# Altium footprint library HerosLib.PcbLib: 110 footprints (part 2 of 7)
Each footprint in its own frame and in the unit in brackets; x right, y up, seen from the top. Pads: shape width x height; smd on the part's side, far side on the other; paste and mask are expansions set on the pad; w line width, h text height; cw(c..) or ccw(c..) is an arc to the next point about the centre after c.
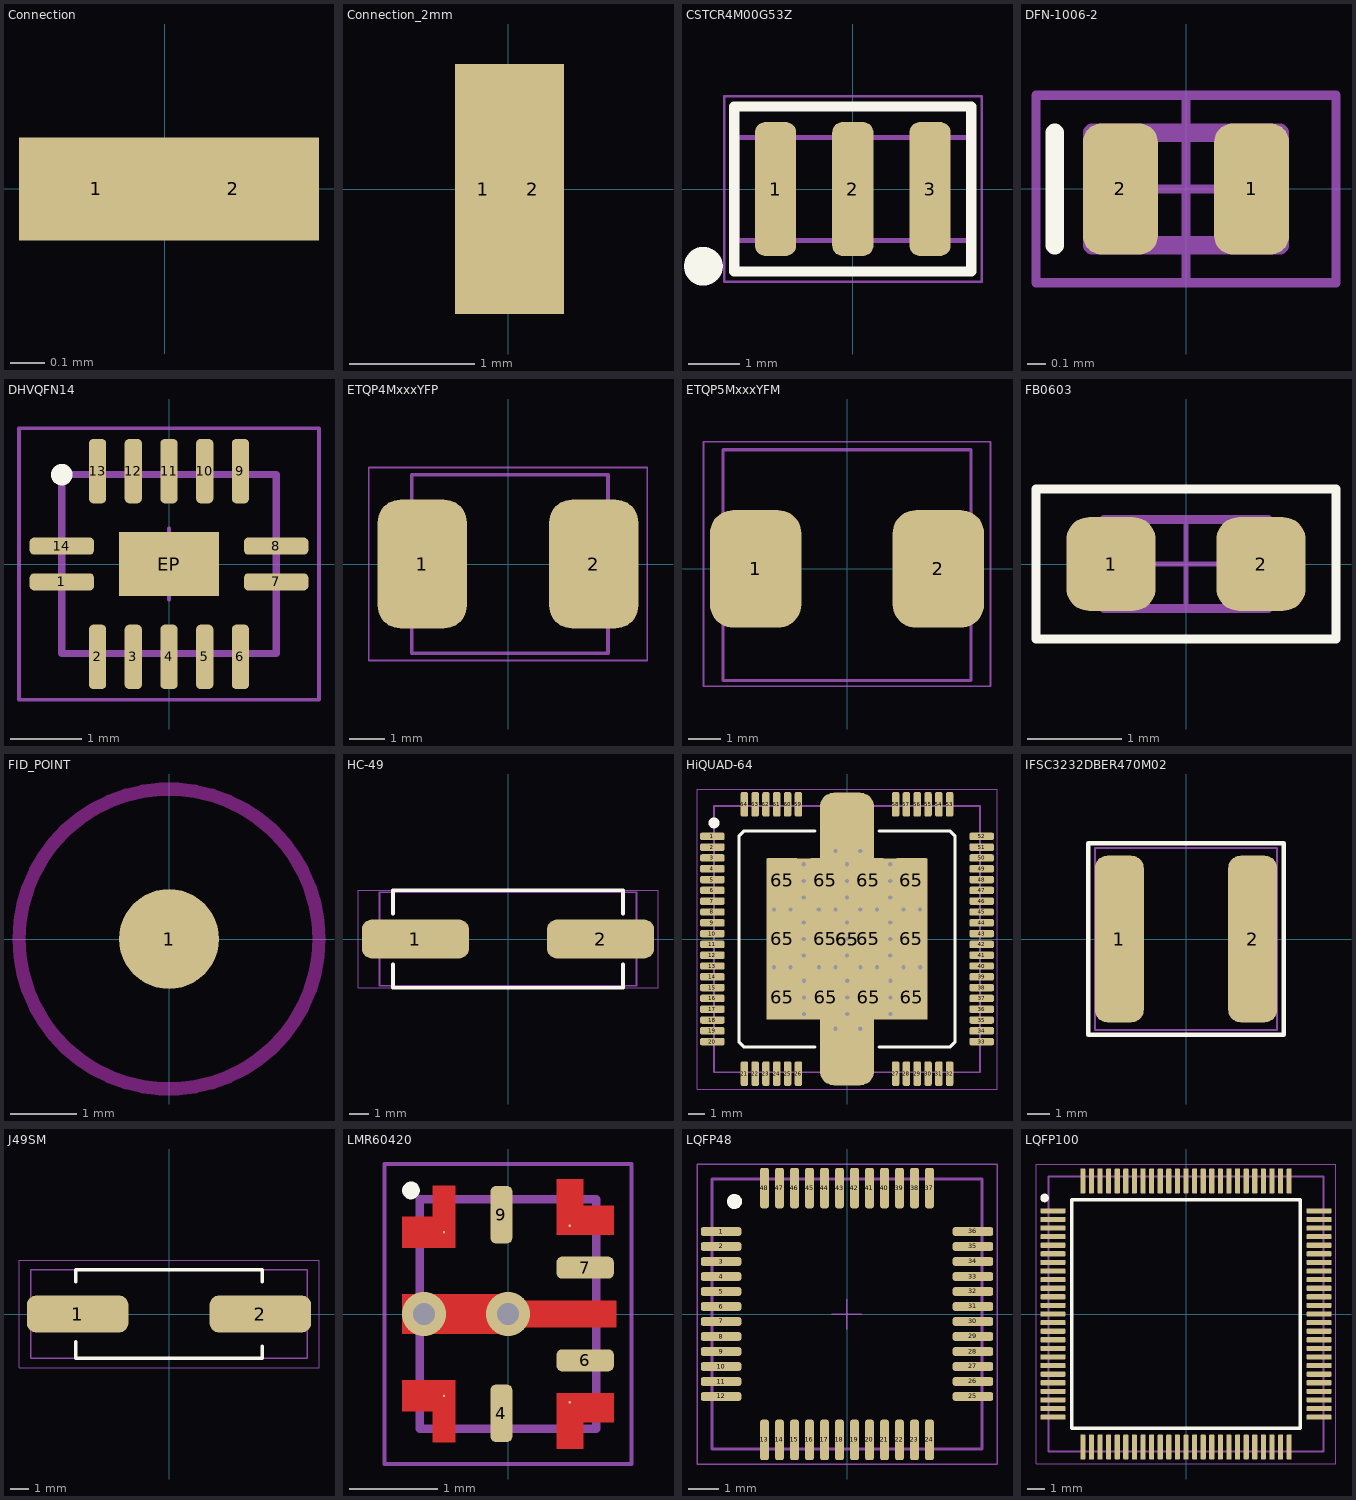
[diagram p1: the footprints below, top view; thin cyan lines are the x and y axes]

## Connection [mm] "No component PCB connection"
pads (2):
  rect 0.45x0.3 smd mask+0.102: 1(-0.2,0)
  rect 0.5x0.3 smd mask+0.102: 2(0.2,0)

## Connection_2mm [mm] "No component PCB connection"
pads (2):
  rect 0.45x2 smd mask+0.102: 1(-0.2,0)
  rect 0.5x2 smd mask+0.102: 2(0.2,0)

## CSTCR4M00G53Z [mm] "0.177\" L x 0.079\" W (4.50mm x 2.00mm)"
height 1.19
pads (3):
  rrect50% 0.8x2.6 smd: 1(-1.5,0) 2(0,0) 3(1.5,0)
Top Overlay:
  circle w0.5: c-2.9,-1.5 r0.125
  lines w0.2: -2.3,-1.6 2.3,-1.6 2.3,1.6 -2.3,1.6 -2.3,-1.6
Mechanical 13:
  lines w0.1: -2.25,-1 -2.25,1 2.3,1 2.3,-1 -2.25,-1
Mechanical 15:
  lines w0.05: -2.5,-1.8 2.5,-1.8 2.5,1.8 -2.5,1.8 -2.5,-1.8
3D body "CSTCR4M00G53Z-R0.STEP": height 1.2, standoff 0, extent -2.25,-1 2.25,1

## DFN-1006-2 [mm] "1 x 0.6mm"
height 0.5
pads (2):
  rrect50% 0.4x0.7 smd: 1(0.35,0) 2(-0.35,0)
Top Overlay:
  lines w0.1: -0.7,-0.3 -0.7,0.3
Mechanical 13:
  lines w0.1: -0.5,-0.3 0.5,-0.3 0.5,0.3 -0.5,0.3 -0.5,-0.3
Mechanical 15:
  lines w0.05: -0.5,0 0.5,0 ; 0,-0.5 0,0.5 ; -0.8,-0.5 0.8,-0.5 0.8,0.5 -0.8,0.5 -0.8,-0.5
3D body "DFN1006-2.stp": height 0.5, standoff 0, extent -0.5,-0.3 0.5,0.3

## DHVQFN14 [mm] "plastic, leadless dual in-line compatible thermal enhanced / very thin quad flat package; 14 terminals; 0.5 mm pitch; 2.5x3x1 mm body"
height 1
pads (15):
  rrect50% 0.9x0.24 smd: 1(-1.5,-0.25) 7(1.5,-0.25) 8(1.5,0.25) 14(-1.5,0.25)
  rrect50% 0.24x0.9 smd: 2(-1,-1.3) 3(-0.5,-1.3) 4(0,-1.3) 5(0.5,-1.3) 6(1,-1.3) 9(1,1.3) 10(0.5,1.3) 11(0,1.3) 12(-0.5,1.3) 13(-1,1.3)
  rect 1.4x0.9 smd paste-2539.97: EP(0,0)
Top Overlay:
  circle w0.2: c-1.501,1.251 r0.05
Top Paste:
  rectangle: -0.3,-0.2 0.3,0.2
Mechanical 13:
  lines w0.1: -1.501,-1.251 -1.501,1.251 1.501,1.251 1.501,-1.251 -1.501,-1.251
Mechanical 15:
  lines w0.05: -0.5,0 0.5,0 ; 0,-0.5 0,0.5 ; -2.1,-1.9 -2.1,1.9 2.1,1.9 2.1,-1.9 -2.1,-1.9
3D body "User Library-DHVQFN 14.STEP": height 0.85, standoff -0.02, extent -1.501,-1.251 1.501,1.251

## ETQP4MxxxYFP [mm] "5.5mm x5mm inductor package"
height 4
pads (2):
  rrect50% 2.5x3.6 smd: 1(-2.4,0) 2(2.4,0)
Mechanical 13:
  lines w0.1: -2.7,-2.5 -2.7,2.5 2.8,2.5 2.8,-2.5 -2.7,-2.5
Mechanical 15:
  lines w0.05: -3.9,-2.7 3.9,-2.7 3.9,2.7 -3.9,2.7 -3.9,-2.7
3D body "ast-ind-365935.STEP": height 4.08, standoff 0.08, extent -2.75,-2.5 2.75,2.5

## ETQP5MxxxYFM [mm] "7.5mm x7mm inductor package"
height 5.4
pads (2):
  rrect50% 2.8x3.6 smd: 1(-2.8,0) 2(2.8,0)
Mechanical 13:
  lines w0.1: -3.8,-3.425 3.8,-3.425 3.8,3.65 -3.8,3.65 -3.8,-3.425
Mechanical 15:
  lines w0.05: -4.4,-3.6 -4.4,3.9 4.4,3.9 4.4,-3.6 -4.4,-3.6
3D body "ast-ind-365942.STEP": height 5.49, standoff 0.09, extent -3.785,-3.375 3.785,3.625

## FB0603 [mm] "Chip Resistor, 2-Leads, Body 1.75x0.95mm"
height 0.55
pads (2):
  rrect50% 0.95x1 smd: 1(-0.8,0) 2(0.8,0)
Top Overlay:
  lines w0.1: -1.6,-0.8 1.6,-0.8 1.6,0.8 -1.6,0.8 -1.6,0.575 -1.6,-0.8
Mechanical 13:
  lines w0.1: -0.875,-0.475 -0.875,0.475 0.875,0.475 0.875,-0.475 -0.875,-0.475
Mechanical 15:
  lines w0.05: -0.5,0 0.5,0 ; 0,-0.5 0,0.5 ; -1.6,-0.8 -1.6,0.8 1.6,0.8 1.6,-0.8 -1.6,-0.8
3D body "RESC1608X06N.step": height 0.55, standoff 0, extent -0.875,-0.475 0.875,0.475

## FID_POINT [mm] "Fiducial point, 1.5 mm x 4.5 mm solder free area"
pads (1):
  round 1.5 smd paste-1.5 mask+1.5: 1(0,0)
Top Layer keep-out:
  circle w0.2: c0,0 r2.25

## HC-49 [mm] "SMD Quartz Crystal, 2 pad version, 11.4 x 4.8 mm"
height 4.3
pads (2):
  rrect50% 5.5x2 smd: 1(-4.75,0) 2(4.75,0)
Top Overlay:
  lines w0.2: -5.9,-1.3 -5.9,-2.5 0,-2.5 5.9,-2.5 5.9,-1.3 ; -5.9,1.3 -5.9,2.5 0,2.5 5.9,2.5 5.9,1.3
Mechanical 13:
  lines w0.1: -6.6,-2.4 -6.6,2.4 6.6,2.4 6.6,-2.4 -6.6,-2.4
Mechanical 15:
  lines w0.05: -7.7,-2.5 7.7,-2.5 7.7,2.5 -7.7,2.5 -7.7,-2.5
3D body "ECS-040-18-5PX-JES-TR.STEP": height 4.3, standoff 0, extent -6.6,-2.39 6.6,2.41

## HiQUAD-64 [mm] "64-Pin HI-QUAD package"
height 2
pads (78):
  rrect50% 1.475x0.45 smd mask+0.05: 1(-8.1,6.175) 2(-8.1,5.525) 3(-8.1,4.875) 4(-8.1,4.225) 5(-8.1,3.575) 6(-8.1,2.925) 7(-8.1,2.275) 8(-8.1,1.625) 9(-8.1,0.975) 10(-8.1,0.325) 11(-8.1,-0.325) 12(-8.1,-0.975) 13(-8.1,-1.625) 14(-8.1,-2.275) 15(-8.1,-2.925) 16(-8.1,-3.575) 17(-8.1,-4.225) 18(-8.1,-4.875) 19(-8.1,-5.525) 20(-8.1,-6.175) 33(8.1,-6.175) 34(8.1,-5.525) 35(8.1,-4.875) 36(8.1,-4.225) 37(8.1,-3.575) 38(8.1,-2.925) 39(8.1,-2.275) 40(8.1,-1.625) 41(8.1,-0.975) 42(8.1,-0.325) 43(8.1,0.325) 44(8.1,0.975) 45(8.1,1.625) 46(8.1,2.275) 47(8.1,2.925) 48(8.1,3.575) 49(8.1,4.225) 50(8.1,4.875) 51(8.1,5.525) 52(8.1,6.175)
  rrect50% 0.45x1.475 smd mask+0.05: 21(-6.175,-8.1) 22(-5.525,-8.1) 23(-4.875,-8.1) 24(-4.225,-8.1) 25(-3.575,-8.1) 26(-2.925,-8.1) 27(2.925,-8.1) 28(3.575,-8.1) 29(4.225,-8.1) 30(4.875,-8.1) 31(5.525,-8.1) 32(6.175,-8.1) 53(6.175,8.1) 54(5.525,8.1) 55(4.875,8.1) 56(4.225,8.1) 57(3.575,8.1) 58(2.925,8.1) 59(-2.925,8.1) 60(-3.575,8.1) 61(-4.225,8.1) 62(-4.875,8.1) 63(-5.525,8.1) 64(-6.175,8.1)
  rect 1.8x2.7 smd paste-10: 65(-3.896,0.021) 65(-3.896,3.521) 65(-3.883,-3.493) 65(-1.304,0.021) 65(-1.304,3.521) 65(-1.291,-3.493) 65(1.287,0.021) 65(1.287,3.521) 65(1.301,-3.493) 65(3.879,0.021) 65(3.879,3.521) 65(3.892,-3.493)
  rrect50% 3.25x17.6 smd paste-10 mask+0.102: 65(0,0)
  rect 9.7x9.7 smd paste-10 mask+0.102: 65(0,0)
via 0,0 diameter 0.5 hole 0.25
via 0.8,-5.4 diameter 0.5 hole 0.25
via -0.7,-5.4 diameter 0.5 hole 0.25
via 0.8,5.3 diameter 0.5 hole 0.25
via -0.7,5.3 diameter 0.5 hole 0.25
via 3.406,-1.698 diameter 0.5 hole 0.25
via 4.406,-1.698 diameter 0.5 hole 0.25
via 0.806,-1.698 diameter 0.5 hole 0.25
via 1.806,-1.698 diameter 0.5 hole 0.25
via -1.694,-1.698 diameter 0.5 hole 0.25
via -0.694,-1.698 diameter 0.5 hole 0.25
via -4.394,-1.698 diameter 0.5 hole 0.25
via -3.394,-1.698 diameter 0.5 hole 0.25
via 3.4,1.769 diameter 0.5 hole 0.25
via 4.4,1.769 diameter 0.5 hole 0.25
via 0.8,1.769 diameter 0.5 hole 0.25
via 1.8,1.769 diameter 0.5 hole 0.25
via -1.7,1.769 diameter 0.5 hole 0.25
via -0.7,1.769 diameter 0.5 hole 0.25
via -4.4,1.769 diameter 0.5 hole 0.25
via -3.4,1.769 diameter 0.5 hole 0.25
via -2.587,-4.514 diameter 0.5 hole 0.25
via -2.587,-2.514 diameter 0.5 hole 0.25
via -2.587,-3.514 diameter 0.5 hole 0.25
via 0.013,-4.514 diameter 0.5 hole 0.25
via 0.013,-2.514 diameter 0.5 hole 0.25
via 0.013,-3.514 diameter 0.5 hole 0.25
via 2.613,-4.514 diameter 0.5 hole 0.25
via 2.613,-2.514 diameter 0.5 hole 0.25
via 2.613,-3.514 diameter 0.5 hole 0.25
via 2.6,-1 diameter 0.5 hole 0.25
via 2.6,1 diameter 0.5 hole 0.25
via 2.6,0 diameter 0.5 hole 0.25
via -2.6,-1 diameter 0.5 hole 0.25
via -2.6,1 diameter 0.5 hole 0.25
via -2.6,0 diameter 0.5 hole 0.25
via -2.6,2.5 diameter 0.5 hole 0.25
via -2.6,4.5 diameter 0.5 hole 0.25
via -2.6,3.5 diameter 0.5 hole 0.25
via 2.6,2.5 diameter 0.5 hole 0.25
via 2.6,4.5 diameter 0.5 hole 0.25
via 2.6,3.5 diameter 0.5 hole 0.25
via 0,2.5 diameter 0.5 hole 0.25
via 0,4.5 diameter 0.5 hole 0.25
via 0,3.5 diameter 0.5 hole 0.25
via 0,-1 diameter 0.5 hole 0.25
via 0,1 diameter 0.5 hole 0.25
Top Overlay:
  circle w0.325: c-8.001,6.985 r0.162
  lines w0.2: -1.95,-6.5 -6.175,-6.5 -6.5,-6.175 -6.5,6.175 -6.175,6.5 -1.95,6.5 ; 1.95,-6.5 6.175,-6.5 6.5,-6.175 6.5,6.175 6.175,6.5 1.95,6.5
Top Paste:
  rectangle: 3,-4.7 4.7,-2
  rectangle: 3,-1.3 4.7,1.4
  rectangle: 3,2.1 4.7,4.8
  rectangle: 0.4,-4.7 2.1,-2
  rectangle: 0.4,-1.3 2.1,1.4
  rectangle: 0.4,2.1 2.1,4.8
  rectangle: -2.2,-4.7 -0.5,-2
  rectangle: -2.2,-1.3 -0.5,1.4
  rectangle: -2.2,2.1 -0.5,4.8
  rectangle: -4.7,-4.7 -3,-2
  rectangle: -4.7,-1.3 -3,1.4
  rectangle: -4.7,2.1 -3,4.8
  region: -1.651,6.015 -1.651,8.047 -1.651,8.122 -1.622,8.269 -1.564,8.408 -1.481,8.533 -1.375,8.639 -1.25,8.722 -1.111,8.78 -0.964,8.809 -0.889,8.809 0.889,8.809 0.964,8.809 1.111,8.78 1.25,8.722 1.375,8.639 1.481,8.533 1.564,8.408 1.622,8.269 1.651,8.122 1.651,8.047 1.651,6.015
  region: 1.651,-6.015 1.651,-8.047 1.651,-8.122 1.622,-8.269 1.564,-8.408 1.481,-8.533 1.375,-8.639 1.25,-8.722 1.111,-8.78 0.964,-8.809 0.889,-8.809 -0.889,-8.809 -0.964,-8.809 -1.111,-8.78 -1.25,-8.722 -1.375,-8.639 -1.481,-8.533 -1.564,-8.408 -1.622,-8.269 -1.651,-8.122 -1.651,-8.047 -1.651,-6.015
Top Solder:
  region: -1.778,5.888 -1.778,8.047 -1.778,8.135 -1.744,8.306 -1.677,8.468 -1.579,8.614 -1.456,8.738 -1.31,8.835 -1.148,8.902 -0.977,8.936 -0.889,8.936 0.889,8.936 0.977,8.936 1.148,8.902 1.31,8.835 1.456,8.738 1.58,8.614 1.677,8.468 1.744,8.306 1.778,8.134 1.778,8.047 1.778,5.888
  region: 1.778,-5.888 1.778,-8.047 1.778,-8.135 1.744,-8.306 1.677,-8.468 1.579,-8.614 1.456,-8.738 1.31,-8.835 1.148,-8.902 0.977,-8.936 0.889,-8.936 -0.889,-8.936 -0.977,-8.936 -1.148,-8.902 -1.31,-8.835 -1.456,-8.738 -1.58,-8.614 -1.677,-8.468 -1.744,-8.306 -1.778,-8.134 -1.778,-8.047 -1.778,-5.888
Mechanical 13:
  lines w0.1: -8.005,-8.008 8,-8.008 8,8.001 -8.005,8.001 -8.005,-8.008
Mechanical 15:
  lines w0.05: -9.025,-9.025 -9.025,9.025 9.025,9.025 9.025,-9.025 -9.025,-9.025
3D body "HiQUAD-64X.stp": height 1.6, standoff 0.01, extent -8.005,-8.008 8.005,8.001

## IFSC3232DBER470M02 [mm] "8mm x 8mm inductor package"
height 4.2
pads (2):
  rrect50% 2.2x7.5 smd: 1(-3,0) 2(3,0)
Top Overlay:
  lines w0.2: -4.4,-4.3 -4.4,4.3 4.4,4.3 4.4,-4.3 -4.4,-4.3
Mechanical 13:
  lines w0.1: -4.1,-4.1 -4.1,4.1 4.1,4.1 4.1,-4.1 -4.1,-4.1
Mechanical 15:
  lines w0.05: -4.4,-4.3 4.4,-4.3 4.4,4.3 -4.4,4.3 -4.4,-4.3
3D body "IND_IFSC-3232DB-01_VIS.step": height 4.19, standoff 0, extent -4.102,-4.102 4.102,4.102

## J49SM [mm] "SMD Quartz Crystal, 2 pad version, 11.5 x 4.8 mm"
height 4
pads (2):
  rrect50% 5.5x2 smd: 1(-4.95,0) 2(4.95,0)
Top Overlay:
  lines w0.2: -5.05,-2.4 -5.05,-1.5 -5.05,-2.4 ; -5.05,-2.4 5,-2.4 -5.05,-2.4 ; -5.05,2.4 5.05,2.4 ; -5.05,2.4 5.05,2.4 ; -5.05,2.4 -5.05,1.75 -5.05,2.4 ; 5.05,2.4 5.05,1.75 5.05,2.4 ; 5.05,-2.4 5.05,-1.75 5.05,-2.4
Mechanical 13:
  lines w0.1: -7.493,-2.4 -7.493,2.4 7.493,2.4 7.493,-2.4 -7.493,-2.4
Mechanical 15:
  lines w0.05: -8.128,-2.921 -8.128,2.921 8.128,2.921 8.128,-2.921 -8.128,-2.921
3D body "J49SMH-P-G-G-K-8M0.stp": height 4.1, standoff 0, extent -7.5,-2.4 7.5,2.4

## LMR60420 [mm] "9-PowerWQFN 2.5X2mm"
height 0.8
pads (9):
  round 0.025 smd: 1(-0.725,0.927) 2(0,0) 3(-0.725,-0.927) 5(0.7,-1) 8(0.7,1)
  rrect50% 0.25x0.65 smd: 4(-0.075,-1.125) 9(-0.075,1.125)
  rrect50% 0.65x0.25 smd: 6(0.875,-0.525) 7(0.875,0.525)
via 0,0 diameter 0.5 hole 0.25
via -0.95,0 diameter 0.5 hole 0.25
Top Layer:
  region: 0.55,-1.525 0.85,-1.525 0.85,-1.225 1.2,-1.225 1.2,-0.9 0.55,-0.9
  region: 0.55,1.525 0.85,1.525 0.85,1.225 1.2,1.225 1.2,0.9 0.55,0.9
  region: -1.2,1.102 -0.85,1.102 -0.85,1.452 -0.6,1.452 -0.6,0.752 -1.2,0.752
  region: -1.2,-1.102 -0.85,-1.102 -0.85,-1.452 -0.6,-1.452 -0.6,-0.752 -1.2,-0.752
  region: -1.2,0.225 -1.2,-0.225 0.1,-0.225 0.175,-0.15 1.225,-0.15 1.225,0.15 0.15,0.15 0.075,0.225
Top Overlay:
  circle w0.1: c-1.1,1.4 r0.05
Mechanical 13:
  lines w0.1: -1,-1.3 1,-1.3 1,1.3 -1,1.3 -1,-1.3
Mechanical 15:
  lines w0.05: -1.4,-1.7 1.4,-1.7 1.4,1.7 -1.4,1.7 -1.4,-1.7
3D body "RAK0009A.stp": height 0.8, standoff 0, extent -0.998,-1.205 1.002,1.295

## LQFP48 [mm] "48 Pin, Body 7x7x1.4"
height 1.4
pads (48):
  rrect50% 1.35x0.29 smd: 1(-4.2,2.75) 2(-4.2,2.25) 3(-4.2,1.75) 4(-4.2,1.25) 5(-4.2,0.75) 6(-4.2,0.25) 7(-4.2,-0.25) 8(-4.2,-0.75) 9(-4.2,-1.25) 10(-4.2,-1.75) 11(-4.2,-2.25) 12(-4.2,-2.75) 25(4.2,-2.75) 26(4.2,-2.25) 27(4.2,-1.75) 28(4.2,-1.25) 29(4.2,-0.75) 30(4.2,-0.25) 31(4.2,0.25) 32(4.2,0.75) 33(4.2,1.25) 34(4.2,1.75) 35(4.2,2.25) 36(4.2,2.75)
  rrect50% 0.29x1.35 smd: 13(-2.75,-4.2) 14(-2.25,-4.2) 15(-1.75,-4.2) 16(-1.25,-4.2) 17(-0.75,-4.2) 18(-0.25,-4.2) 19(0.25,-4.2) 20(0.75,-4.2) 21(1.25,-4.2) 22(1.75,-4.2) 23(2.25,-4.2) 24(2.75,-4.2) 37(2.75,4.2) 38(2.25,4.2) 39(1.75,4.2) 40(1.25,4.2) 41(0.75,4.2) 42(0.25,4.2) 43(-0.25,4.2) 44(-0.75,4.2) 45(-1.25,4.2) 46(-1.75,4.2) 47(-2.25,4.2) 48(-2.75,4.2)
Top Overlay:
  circle w0.25: c-3.75,3.75 r0.125
Mechanical 13:
  lines w0.1: -4.5,-4.5 -4.5,4.5 4.5,4.5 4.5,-4.5 -4.5,-4.5
Mechanical 15:
  lines w0.05: -0.5,0 0.5,0 ; 0,-0.5 0,0.5 ; -5,-5 -5,5 5,5 5,-5 -5,-5
3D body "LQFP48.STEP": height 1.5, standoff 0, extent -4.513,-4.513 4.513,4.513

## LQFP100 [mm] "Plastic low profile quad flat package; 100 leads; 0.5 mm pitch, 14 mm x 14 mm x 1.4 mm body"
height 1.4
pads (100):
  rrect50% 1.475x0.3 smd mask+0.05: 1(-7.738,6) 2(-7.738,5.5) 3(-7.738,5) 4(-7.738,4.5) 5(-7.738,4) 6(-7.738,3.5) 7(-7.738,3) 8(-7.738,2.5) 9(-7.738,2) 10(-7.738,1.5) 11(-7.738,1) 12(-7.738,0.5) 13(-7.738,0) 14(-7.738,-0.5) 15(-7.738,-1) 16(-7.738,-1.5) 17(-7.738,-2) 18(-7.738,-2.5) 19(-7.738,-3) 20(-7.738,-3.5) 21(-7.738,-4) 22(-7.738,-4.5) 23(-7.738,-5) 24(-7.738,-5.5) 25(-7.738,-6) 51(7.738,-6) 52(7.738,-5.5) 53(7.738,-5) 54(7.738,-4.5) 55(7.738,-4) 56(7.738,-3.5) 57(7.738,-3) 58(7.738,-2.5) 59(7.738,-2) 60(7.738,-1.5) 61(7.738,-1) 62(7.738,-0.5) 63(7.738,0) 64(7.738,0.5) 65(7.738,1) 66(7.738,1.5) 67(7.738,2) 68(7.738,2.5) 69(7.738,3) 70(7.738,3.5) 71(7.738,4) 72(7.738,4.5) 73(7.738,5) 74(7.738,5.5) 75(7.738,6)
  rrect50% 0.3x1.475 smd mask+0.05: 26(-6,-7.738) 27(-5.5,-7.738) 28(-5,-7.738) 29(-4.5,-7.738) 30(-4,-7.738) 31(-3.5,-7.738) 32(-3,-7.738) 33(-2.5,-7.738) 34(-2,-7.738) 35(-1.5,-7.738) 36(-1,-7.738) 37(-0.5,-7.738) 38(0,-7.738) 39(0.5,-7.738) 40(1,-7.738) 41(1.5,-7.738) 42(2,-7.738) 43(2.5,-7.738) 44(3,-7.738) 45(3.5,-7.738) 46(4,-7.738) 47(4.5,-7.738) 48(5,-7.738) 49(5.5,-7.738) 50(6,-7.738) 76(6,7.738) 77(5.5,7.738) 78(5,7.738) 79(4.5,7.738) 80(4,7.738) 81(3.5,7.738) 82(3,7.738) 83(2.5,7.738) 84(2,7.738) 85(1.5,7.738) 86(1,7.738) 87(0.5,7.738) 88(0,7.738) 89(-0.5,7.738) 90(-1,7.738) 91(-1.5,7.738) 92(-2,7.738) 93(-2.5,7.738) 94(-3,7.738) 95(-3.5,7.738) 96(-4,7.738) 97(-4.5,7.738) 98(-5,7.738) 99(-5.5,7.738) 100(-6,7.738)
Top Overlay:
  circle w0.25: c-8.225,6.75 r0.125
  lines w0.2: -6.65,-6.65 6.65,-6.65 6.65,6.65 -6.65,6.65 -6.65,-6.65
Mechanical 13:
  lines w0.1: -8,-8 8,-8 8,8 -8,8 -8,-8
Mechanical 15:
  lines w0.05: -8.725,-8.725 8.725,-8.725 8.725,8.725 -8.725,8.725 -8.725,-8.725
3D body "ATSAME70N20A-ANT.stp": height 1.6, standoff 0, extent -8,-8 8,8